# Altium footprint library Connectors THD.PcbLib: 631 footprints (part 42 of 46) (continued)
## TYCO_350584-4 [mm] "4 Circuits In-Line - Universal MATE-N-LOK Connector" (continued)

## TYCO_350711-1 [mm] "6 Circuits Mini-Universal MATE-N-LOK Connector"
height 14.73
pads (6):
  round 2.5 hole 1.8: 1(-6.35,-3.175) 2(0,-3.175) 3(6.35,-3.175) 4(-6.35,3.175) 5(0,3.175) 6(6.35,3.175)
Top Overlay:
  circle w0.2: c-6.35,3.175 r2.984
  circle w0.2: c-6.35,3.175 r2.604
  circle w0.2: c6.35,3.175 r2.984
  circle w0.2: c6.35,3.175 r2.604
  circle w0.2: c0,-3.175 r2.984
  circle w0.2: c0,-3.175 r2.604
  lines w0.2: -10.16,-6.985 -10.16,6.985 ; -10.16,-5.715 -11.43,-5.715 -11.43,-6.985 11.43,-6.985 11.43,-5.715 10.16,-5.715 ; -10.16,-0.635 -11.43,-0.635 -11.43,0.635 -10.16,0.635 ; -10.16,5.715 -11.43,5.715 -11.43,6.985 11.43,6.985 11.43,5.715 10.16,5.715 ; -1.981,-6.985 -1.981,-9.525 1.956,-9.525 1.956,-6.985 ; -1.981,6.985 -1.981,9.525 1.956,9.525 1.956,6.985 ; 10.16,-6.985 10.16,6.985 ; 10.16,-0.635 11.43,-0.635 11.43,0.635 10.16,0.635 ; -2.984,6.16 -2.984,3.175 ccw(c0,3.175) 2.984,3.175 2.985,6.16 ; -2.984,6.16 2.985,6.16 ; -2.985,6.16 -2.604,5.779 ; -2.604,5.779 2.604,5.779 ; -2.604,5.779 -2.604,3.175 ccw(c0,3.175) 2.604,3.175 2.604,5.779 ; 2.604,5.779 2.985,6.16 ; -9.334,-6.16 -9.334,-3.175 cw(c-6.35,-3.175) -3.366,-3.175 -3.366,-6.16 -9.334,-6.16 ; -8.954,-5.779 -8.954,-3.175 cw(c-6.35,-3.175) -3.747,-3.175 -3.747,-5.779 -8.954,-5.779 ; 3.366,-6.16 3.366,-3.175 cw(c6.35,-3.175) 9.334,-3.175 9.335,-6.16 3.366,-6.16 ; 3.747,-5.779 3.747,-3.175 cw(c6.35,-3.175) 8.954,-3.175 8.954,-5.779 3.747,-5.779
  text "3" at 10.78,-3.71 h1.2
  text "6" at 10.78,2.64 h1.2
  text "4" at -11.605,2.61 h1.2
  text "1" at -11.055,-3.765 h1.2
Mechanical 8:
  lines w0.1: -6.85,-3.175 -6.35,-3.175 ; -6.85,3.175 -6.35,3.175 ; -6.35,-3.675 -6.35,-3.175 ; -6.35,-2.675 -6.35,-3.175 ; -6.35,2.675 -6.35,3.175 ; -6.35,3.675 -6.35,3.175 ; -5.85,-3.175 -6.35,-3.175 ; -5.85,3.175 -6.35,3.175 ; -0.5,-3.175 0,-3.175 ; -0.5,0 0,0 ; -0.5,3.175 0,3.175 ; 0,-3.675 0,-3.175 ; 0,-2.675 0,-3.175 ; 0,-0.5 0,0 ; 0,0.5 0,0 ; 0,2.675 0,3.175 ; 0,3.675 0,3.175 ; 0.5,-3.175 0,-3.175 ; 0.5,0 0,0 ; 0.5,3.175 0,3.175 ; 5.85,-3.175 6.35,-3.175 ; 5.85,3.175 6.35,3.175 ; 6.35,-3.675 6.35,-3.175 ; 6.35,-2.675 6.35,-3.175 ; 6.35,2.675 6.35,3.175 ; 6.35,3.675 6.35,3.175 ; 6.85,-3.175 6.35,-3.175 ; 6.85,3.175 6.35,3.175
Mechanical 14:
  circle w0.1: c-6.35,3.175 r2.984
  circle w0.1: c-6.35,3.175 r2.604
  circle w0.1: c6.35,3.175 r2.984
  circle w0.1: c6.35,3.175 r2.604
  circle w0.1: c0,-3.175 r2.984
  circle w0.1: c0,-3.175 r2.604
  lines w0.1: -10.16,-6.985 -10.16,6.985 ; -10.16,-5.715 -11.43,-5.715 -11.43,-6.985 11.43,-6.985 11.43,-5.715 10.16,-5.715 ; -10.16,-0.635 -11.43,-0.635 -11.43,0.635 -10.16,0.635 ; -10.16,5.715 -11.43,5.715 -11.43,6.985 11.43,6.985 11.43,5.715 10.16,5.715 ; -1.981,-6.985 -1.981,-9.525 1.956,-9.525 1.956,-6.985 ; -1.981,6.985 -1.981,9.525 1.956,9.525 1.956,6.985 ; 10.16,-6.985 10.16,6.985 ; 10.16,-0.635 11.43,-0.635 11.43,0.635 10.16,0.635 ; -2.984,6.16 -2.984,3.175 ccw(c0,3.175) 2.984,3.175 2.985,6.16 ; -2.984,6.16 2.985,6.16 ; -2.985,6.16 -2.604,5.779 ; -2.604,5.779 2.604,5.779 ; -2.604,5.779 -2.604,3.175 ccw(c0,3.175) 2.604,3.175 2.604,5.779 ; 2.604,5.779 2.985,6.16 ; -9.334,-6.16 -9.334,-3.175 cw(c-6.35,-3.175) -3.366,-3.175 -3.366,-6.16 -9.334,-6.16 ; -8.954,-5.779 -8.954,-3.175 cw(c-6.35,-3.175) -3.747,-3.175 -3.747,-5.779 -8.954,-5.779 ; 3.366,-6.16 3.366,-3.175 cw(c6.35,-3.175) 9.334,-3.175 9.335,-6.16 3.366,-6.16 ; 3.747,-5.779 3.747,-3.175 cw(c6.35,-3.175) 8.954,-3.175 8.954,-5.779 3.747,-5.779
  text "3" at 10.78,-3.71 h1.2
  text "6" at 10.78,2.64 h1.2
  text "4" at -11.605,2.61 h1.2
  text "1" at -11.055,-3.765 h1.2
3D body: height 14.82, standoff -3.56, extent -11.43,-9.525 11.43,9.525

## TYCO_350712-1 [mm] "9 Circuits Mini-Universal MATE-N-LOK Connector"
height 14.73
pads (9):
  round 2.5 hole 1.8: 1(-6.35,6.35) 2(-6.35,0) 3(-6.35,-6.35) 4(0,6.35) 5(0,0) 6(0,-6.35) 7(6.35,6.35) 8(6.35,0) 9(6.35,-6.35)
Top Overlay:
  circle w0.2: c-6.35,0.032 r3.016
  circle w0.2: c6.35,6.382 r3.016
  circle w0.2: c6.35,-6.318 r3.016
  circle w0.2: c0,-6.318 r3.016
  circle w0.2: c0,0.032 r3.016
  circle w0.2: c0,6.382 r3.016
  lines w0.2: -10.16,-1.956 -12.7,-1.956 -12.7,1.981 -10.16,1.981 ; 10.16,-1.981 12.7,-1.981 12.7,1.956 10.16,1.956 ; -10.16,-11.43 -8.89,-11.43 -8.89,-10.16 -3.81,-10.16 -3.81,-11.43 -2.54,-11.43 -2.54,-10.16 2.54,-10.16 2.54,-11.43 3.81,-11.43 3.81,-10.16 8.89,-10.16 8.89,-11.43 10.16,-11.43 10.16,11.43 8.89,11.43 8.89,10.16 3.81,10.16 3.81,11.43 2.54,11.43 2.54,10.16 -2.54,10.16 -2.54,11.43 -3.81,11.43 -3.81,10.16 -8.89,10.16 -8.89,11.43 -10.16,11.43 -10.16,-11.43 ; -9.335,-9.335 -6.35,-9.335 ccw(c-6.35,-6.35) -6.35,-3.366 -9.335,-3.366 -9.335,-9.335 ; -9.335,3.366 -6.35,3.366 ccw(c-6.35,6.35) -6.35,9.334 -9.334,9.335 -9.335,3.366 ; 6.35,-2.984 cw(c6.35,0) 6.35,2.984 9.335,2.984 9.335,-2.985 6.35,-2.984
  text "7" at 6.773,10.627 h1.02
  text "4" at 0.465,10.63 h1.02
  text "1" at -5.885,10.63 h1.02
  text "6" at 0.465,-11.27 h1.02
  text "3" at -5.935,-11.27 h1.02
  text "9" at 6.765,-11.27 h1.02
Mechanical 8:
  lines w0.1: -7.35,-6.35 -6.35,-6.35 ; -7.35,0 -6.35,0 ; -7.35,6.35 -6.35,6.35 ; -6.35,-7.35 -6.35,-6.35 ; -6.35,-5.35 -6.35,-6.35 ; -6.35,-1 -6.35,0 ; -6.35,1 -6.35,0 ; -6.35,5.35 -6.35,6.35 ; -6.35,7.35 -6.35,6.35 ; -5.35,-6.35 -6.35,-6.35 ; -5.35,0 -6.35,0 ; -5.35,6.35 -6.35,6.35 ; -1,-6.35 0,-6.35 ; -1,0 0,0 ; -1,6.35 0,6.35 ; 0,-7.35 0,-6.35 ; 0,-5.35 0,-6.35 ; 0,-1 0,0 ; 0,1 0,0 ; 0,5.35 0,6.35 ; 0,7.35 0,6.35 ; 1,-6.35 0,-6.35 ; 1,0 0,0 ; 1,6.35 0,6.35 ; 5.35,-6.35 6.35,-6.35 ; 5.35,0 6.35,0 ; 5.35,6.35 6.35,6.35 ; 6.35,-7.35 6.35,-6.35 ; 6.35,-5.35 6.35,-6.35 ; 6.35,-1 6.35,0 ; 6.35,1 6.35,0 ; 6.35,5.35 6.35,6.35 ; 6.35,7.35 6.35,6.35 ; 7.35,-6.35 6.35,-6.35 ; 7.35,0 6.35,0 ; 7.35,6.35 6.35,6.35
Mechanical 14:
  circle w0.1: c-6.35,0.032 r3.016
  circle w0.1: c6.35,6.382 r3.016
  circle w0.1: c6.35,-6.318 r3.016
  circle w0.1: c0,-6.318 r3.016
  circle w0.1: c0,0.032 r3.016
  circle w0.1: c0,6.382 r3.016
  lines w0.1: -10.16,-1.956 -12.7,-1.956 -12.7,1.981 -10.16,1.981 ; 10.16,-1.981 12.7,-1.981 12.7,1.956 10.16,1.956 ; -10.16,-11.43 -8.89,-11.43 -8.89,-10.16 -3.81,-10.16 -3.81,-11.43 -2.54,-11.43 -2.54,-10.16 2.54,-10.16 2.54,-11.43 3.81,-11.43 3.81,-10.16 8.89,-10.16 8.89,-11.43 10.16,-11.43 10.16,11.43 8.89,11.43 8.89,10.16 3.81,10.16 3.81,11.43 2.54,11.43 2.54,10.16 -2.54,10.16 -2.54,11.43 -3.81,11.43 -3.81,10.16 -8.89,10.16 -8.89,11.43 -10.16,11.43 -10.16,-11.43 ; -9.335,-9.335 -6.35,-9.335 ccw(c-6.35,-6.35) -6.35,-3.366 -9.335,-3.366 -9.335,-9.335 ; -9.335,3.366 -6.35,3.366 ccw(c-6.35,6.35) -6.35,9.334 -9.334,9.335 -9.335,3.366 ; 6.35,-2.984 cw(c6.35,0) 6.35,2.984 9.335,2.984 9.335,-2.985 6.35,-2.984
  text "7" at 6.773,10.627 h1.02
  text "4" at 0.465,10.63 h1.02
  text "1" at -5.885,10.63 h1.02
  text "6" at 0.465,-11.27 h1.02
  text "3" at -5.935,-11.27 h1.02
  text "9" at 6.765,-11.27 h1.02
3D body: height 14.82, standoff -3.56, extent -12.7,-11.43 12.7,11.43

## TYCO_350713-1 [mm] "12 Circuits Mini-Universal MATE-N-LOK Connector"
height 14.73
pads (12):
  round 2.5 hole 1.8: 1(-9.525,6.35) 2(-9.525,0) 3(-9.525,-6.35) 4(-3.175,6.35) 5(-3.175,0) 6(-3.175,-6.35) 7(3.175,6.35) 8(3.175,0) 9(3.175,-6.35) 10(9.525,6.35) 11(9.525,0) 12(9.525,-6.35)
Top Overlay:
  circle w0.2: c-9.525,0 r2.984
  circle w0.2: c-3.175,6.35 r2.984
  circle w0.2: c-3.175,0 r2.984
  circle w0.2: c-3.175,-6.35 r2.984
  circle w0.2: c3.175,-6.35 r2.984
  circle w0.2: c3.175,0 r2.984
  circle w0.2: c3.175,6.35 r2.984
  circle w0.2: c9.525,6.35 r2.984
  circle w0.2: c9.525,-6.35 r2.984
  lines w0.2: -13.335,-10.16 13.335,-10.16 ; -13.335,-1.981 -15.875,-1.981 -15.875,1.956 -13.335,1.956 ; -13.335,10.16 13.335,10.16 ; -12.065,-10.16 -12.065,-11.43 -13.335,-11.43 -13.335,11.43 -12.065,11.43 -12.065,10.16 ; -6.985,-10.16 -6.985,-11.43 -5.715,-11.43 -5.715,-10.16 ; -6.985,10.16 -6.985,11.43 -5.715,11.43 -5.715,10.16 ; -0.635,-10.16 -0.635,-11.43 0.635,-11.43 0.635,-10.16 ; -0.635,10.16 -0.635,11.43 0.635,11.43 0.635,10.16 ; 5.715,-10.16 5.715,-11.43 6.985,-11.43 6.985,-10.16 ; 5.715,10.16 5.715,11.43 6.985,11.43 6.985,10.16 ; 12.065,-10.16 12.065,-11.43 13.335,-11.43 13.335,11.43 12.065,11.43 12.065,10.16 ; 13.335,-1.981 15.875,-1.981 15.875,1.956 13.335,1.956 ; -12.51,-9.335 -9.525,-9.334 ccw(c-9.525,-6.35) -9.525,-3.366 -12.51,-3.366 -12.51,-9.335 ; -12.51,3.366 -12.51,9.335 -9.525,9.334 cw(c-9.525,6.35) -9.525,3.366 -12.51,3.366 ; 9.525,-2.984 cw(c9.525,0) 9.525,2.984 12.51,2.985 12.51,-2.985 9.525,-2.984
  text "10" at 9.948,10.652 h1.02
  text "12" at 9.94,-12.17 h1.02
  text "7" at 3.598,10.627 h1.02
  text "4" at -2.71,10.63 h1.02
  text "1" at -9.06,10.63 h1.02
  text "6" at -2.71,-11.27 h1.02
  text "3" at -9.11,-11.27 h1.02
  text "9" at 3.59,-11.27 h1.02
Mechanical 8:
  lines w0.1: -10.025,-6.35 -9.525,-6.35 ; -10.025,0 -9.525,0 ; -10.025,6.35 -9.525,6.35 ; -9.525,-6.85 -9.525,-6.35 ; -9.525,-5.85 -9.525,-6.35 ; -9.525,-0.5 -9.525,0 ; -9.525,0.5 -9.525,0 ; -9.525,5.85 -9.525,6.35 ; -9.525,6.85 -9.525,6.35 ; -9.025,-6.35 -9.525,-6.35 ; -9.025,0 -9.525,0 ; -9.025,6.35 -9.525,6.35 ; -3.675,-6.35 -3.175,-6.35 ; -3.675,0 -3.175,0 ; -3.675,6.35 -3.175,6.35 ; -3.175,-6.85 -3.175,-6.35 ; -3.175,-5.85 -3.175,-6.35 ; -3.175,-0.5 -3.175,0 ; -3.175,0.5 -3.175,0 ; -3.175,5.85 -3.175,6.35 ; -3.175,6.85 -3.175,6.35 ; -2.675,-6.35 -3.175,-6.35 ; -2.675,0 -3.175,0 ; -2.675,6.35 -3.175,6.35 ; -0.5,0 0,0 ; 0,-0.5 0,0 ; 0,0.5 0,0 ; 0.5,0 0,0 ; 2.675,-6.35 3.175,-6.35 ; 2.675,0 3.175,0 ; 2.675,6.35 3.175,6.35 ; 3.175,-6.85 3.175,-6.35 ; 3.175,-5.85 3.175,-6.35 ; 3.175,-0.5 3.175,0 ; 3.175,0.5 3.175,0 ; 3.175,5.85 3.175,6.35 ; 3.175,6.85 3.175,6.35 ; 3.675,-6.35 3.175,-6.35 ; 3.675,0 3.175,0 ; 3.675,6.35 3.175,6.35 ; 9.025,-6.35 9.525,-6.35 ; 9.025,0 9.525,0 ; 9.025,6.35 9.525,6.35 ; 9.525,-6.85 9.525,-6.35 ; 9.525,-5.85 9.525,-6.35 ; 9.525,-0.5 9.525,0 ; 9.525,0.5 9.525,0 ; 9.525,5.85 9.525,6.35 ; 9.525,6.85 9.525,6.35 ; 10.025,-6.35 9.525,-6.35 ; 10.025,0 9.525,0 ; 10.025,6.35 9.525,6.35
Mechanical 14:
  circle w0.1: c-9.525,0 r2.984
  circle w0.1: c-3.175,6.35 r2.984
  circle w0.1: c-3.175,0 r2.984
  circle w0.1: c-3.175,-6.35 r2.984
  circle w0.1: c3.175,-6.35 r2.984
  circle w0.1: c3.175,0 r2.984
  circle w0.1: c3.175,6.35 r2.984
  circle w0.1: c9.525,6.35 r2.984
  circle w0.1: c9.525,-6.35 r2.984
  lines w0.1: -13.335,-10.16 13.335,-10.16 ; -13.335,-1.981 -15.875,-1.981 -15.875,1.956 -13.335,1.956 ; -13.335,10.16 13.335,10.16 ; -12.065,-10.16 -12.065,-11.43 -13.335,-11.43 -13.335,11.43 -12.065,11.43 -12.065,10.16 ; -6.985,-10.16 -6.985,-11.43 -5.715,-11.43 -5.715,-10.16 ; -6.985,10.16 -6.985,11.43 -5.715,11.43 -5.715,10.16 ; -0.635,-10.16 -0.635,-11.43 0.635,-11.43 0.635,-10.16 ; -0.635,10.16 -0.635,11.43 0.635,11.43 0.635,10.16 ; 5.715,-10.16 5.715,-11.43 6.985,-11.43 6.985,-10.16 ; 5.715,10.16 5.715,11.43 6.985,11.43 6.985,10.16 ; 12.065,-10.16 12.065,-11.43 13.335,-11.43 13.335,11.43 12.065,11.43 12.065,10.16 ; 13.335,-1.981 15.875,-1.981 15.875,1.956 13.335,1.956 ; -12.51,-9.335 -9.525,-9.334 ccw(c-9.525,-6.35) -9.525,-3.366 -12.51,-3.366 -12.51,-9.335 ; -12.51,3.366 -12.51,9.335 -9.525,9.334 cw(c-9.525,6.35) -9.525,3.366 -12.51,3.366 ; 9.525,-2.984 cw(c9.525,0) 9.525,2.984 12.51,2.985 12.51,-2.985 9.525,-2.984
  text "10" at 9.948,10.652 h1.02
  text "12" at 9.94,-12.17 h1.02
  text "7" at 3.598,10.627 h1.02
  text "4" at -2.71,10.63 h1.02
  text "1" at -9.06,10.63 h1.02
  text "6" at -2.71,-11.27 h1.02
  text "3" at -9.11,-11.27 h1.02
  text "9" at 3.59,-11.27 h1.02
3D body: height 14.82, standoff -3.56, extent -15.875,-11.43 15.875,11.43

## TYCO_350786-1 [mm] "2 Circuits In-Line - Mini-Universal MATE-N-LOK Connector"
height 14.73
pads (2):
  round 2.5 hole 1.8: 1(-3.175,0) 2(3.175,0)
Top Overlay:
  lines w0.2: -7.325,-1.27 -7.325,1.27 ; -5.715,-3.81 -5.715,-5.08 -6.985,-5.08 -6.985,-3.81 ; -0.635,-3.81 -0.635,-5.08 0.635,-5.08 0.635,-3.81 ; 5.715,-3.81 5.715,-5.08 6.985,-5.08 6.985,-3.81 ; 7.325,-1.27 7.325,1.27 ; -6.985,-3.81 -6.985,-1.27 -9.525,-1.27 -9.525,1.27 -6.985,1.27 -6.985,3.81 6.985,3.81 6.985,1.27 9.525,1.27 9.525,-1.27 6.985,-1.27 6.985,-3.81 ; -6.985,-3.81 6.985,-3.81 ; -6.16,-2.985 -6.159,0 cw(c-3.175,0) -0.191,0 -0.191,-2.985 ; -6.16,-2.985 -0.191,-2.985 ; -6.16,-2.985 -5.779,-2.604 ; -5.779,-2.604 -0.572,-2.604 ; -5.779,-2.604 -5.779,0 cw(c-3.175,0) -0.572,0 -0.572,-2.604 ; -0.572,-2.604 -0.191,-2.985 ; 0.191,-2.985 0.191,0 cw(c3.175,0) 6.159,0 6.16,-2.985 ; 0.191,-2.985 6.16,-2.985 ; 0.191,-2.985 0.572,-2.604 ; 0.572,-2.604 5.779,-2.604 ; 0.572,-2.604 0.572,0 cw(c3.175,0) 5.779,0 5.779,-2.604 ; 5.779,-2.604 6.16,-2.985
  text "2" at 3.81,-4.905 h1.02
  text "1" at -2.54,-4.68 h1.02
Mechanical 8:
  lines w0.1: -1,0 0,0 0,-1
Mechanical 14:
  lines w0.1: -7.325,-1.27 -7.325,1.27 ; -5.715,-3.81 -5.715,-5.08 -6.985,-5.08 -6.985,-3.81 ; -0.635,-3.81 -0.635,-5.08 0.635,-5.08 0.635,-3.81 ; 5.715,-3.81 5.715,-5.08 6.985,-5.08 6.985,-3.81 ; 7.325,-1.27 7.325,1.27 ; -6.985,-3.81 -6.985,-1.27 -9.525,-1.27 -9.525,1.27 -6.985,1.27 -6.985,3.81 6.985,3.81 6.985,1.27 9.525,1.27 9.525,-1.27 6.985,-1.27 6.985,-3.81 ; -6.985,-3.81 6.985,-3.81 ; -6.16,-2.985 -6.159,0 cw(c-3.175,0) -0.191,0 -0.191,-2.985 ; -6.16,-2.985 -0.191,-2.985 ; -6.16,-2.985 -5.779,-2.604 ; -5.779,-2.604 -0.572,-2.604 ; -5.779,-2.604 -5.779,0 cw(c-3.175,0) -0.572,0 -0.572,-2.604 ; -0.572,-2.604 -0.191,-2.985 ; 0.191,-2.985 0.191,0 cw(c3.175,0) 6.159,0 6.16,-2.985 ; 0.191,-2.985 6.16,-2.985 ; 0.191,-2.985 0.572,-2.604 ; 0.572,-2.604 5.779,-2.604 ; 0.572,-2.604 0.572,0 cw(c3.175,0) 5.779,0 5.779,-2.604 ; 5.779,-2.604 6.16,-2.985
  text "2" at 3.81,-4.905 h1.02
  text "1" at -2.54,-4.68 h1.02
3D body: height 14.82, standoff -3.56, extent -9.525,-5.08 9.525,3.81

## TYCO_350789-1 [mm] "3 Circuits In-Line - Mini-Universal MATE-N-LOK Connector"
height 14.73
pads (3):
  round 2.5 hole 1.8: 1(-6.35,0) 2(0,0) 3(6.35,0)
Top Overlay:
  circle w0.2: c0,0 r2.984
  circle w0.2: c0,0 r2.604
  lines w0.2: -10.5,-1.27 -10.5,1.27 ; -8.89,-3.81 -8.89,-5.08 -10.16,-5.08 -10.16,-3.81 ; -3.81,-3.81 -3.81,-5.08 -2.54,-5.08 -2.54,-3.81 ; 2.54,-3.81 2.54,-5.08 3.81,-5.08 3.81,-3.81 ; 8.91,-3.81 8.89,-5.08 10.16,-5.08 10.16,-3.81 ; 10.5,-1.27 10.5,1.27 ; -10.16,-3.81 -10.16,-1.27 -12.7,-1.27 -12.7,1.27 -10.16,1.27 -10.16,3.81 10.16,3.81 10.16,1.27 12.7,1.27 12.7,-1.27 10.16,-1.27 10.16,-3.81 ; -10.16,-3.81 10.16,-3.81 ; -9.335,-2.985 -8.954,-2.604 ; -9.335,-2.985 -9.334,0 cw(c-6.35,0) -3.366,0 -3.366,-2.985 ; -9.335,-2.985 -3.366,-2.985 ; -8.954,-2.604 -8.954,0 cw(c-6.35,0) -3.746,0 -3.747,-2.604 ; -8.954,-2.604 -3.747,-2.604 ; -3.747,-2.604 -3.366,-2.985 ; 3.366,-2.985 3.747,-2.604 ; 3.366,-2.985 9.335,-2.985 ; 3.366,-2.985 3.366,0 cw(c6.35,0) 9.334,0 9.335,-2.985 ; 3.747,-2.604 3.747,0 cw(c6.35,0) 8.954,0 8.954,-2.604 ; 3.747,-2.604 8.954,-2.604 ; 8.954,-2.604 9.335,-2.985
  text "1" at -5.715,-5.08 h1.02
  text "2" at 0.635,-5.08 h1.02
  text "3" at 6.985,-5.08 h1.02
Mechanical 14:
  circle w0.1: c0,0 r2.984
  circle w0.1: c0,0 r2.604
  lines w0.1: -10.5,-1.27 -10.5,1.27 ; -8.89,-3.81 -8.89,-5.08 -10.16,-5.08 -10.16,-3.81 ; -3.81,-3.81 -3.81,-5.08 -2.54,-5.08 -2.54,-3.81 ; 2.54,-3.81 2.54,-5.08 3.81,-5.08 3.81,-3.81 ; 8.91,-3.81 8.89,-5.08 10.16,-5.08 10.16,-3.81 ; 10.5,-1.27 10.5,1.27 ; -10.16,-3.81 -10.16,-1.27 -12.7,-1.27 -12.7,1.27 -10.16,1.27 -10.16,3.81 10.16,3.81 10.16,1.27 12.7,1.27 12.7,-1.27 10.16,-1.27 10.16,-3.81 ; -10.16,-3.81 10.16,-3.81 ; -9.335,-2.985 -8.954,-2.604 ; -9.335,-2.985 -9.334,0 cw(c-6.35,0) -3.366,0 -3.366,-2.985 ; -9.335,-2.985 -3.366,-2.985 ; -8.954,-2.604 -8.954,0 cw(c-6.35,0) -3.746,0 -3.747,-2.604 ; -8.954,-2.604 -3.747,-2.604 ; -3.747,-2.604 -3.366,-2.985 ; 3.366,-2.985 3.747,-2.604 ; 3.366,-2.985 9.335,-2.985 ; 3.366,-2.985 3.366,0 cw(c6.35,0) 9.334,0 9.335,-2.985 ; 3.747,-2.604 3.747,0 cw(c6.35,0) 8.954,0 8.954,-2.604 ; 3.747,-2.604 8.954,-2.604 ; 8.954,-2.604 9.335,-2.985
  text "1" at -5.715,-5.08 h1.02
  text "2" at 0.635,-5.08 h1.02
  text "3" at 6.985,-5.08 h1.02
3D body: height 14.82, standoff -3.56, extent -12.7,-5.08 12.7,3.81

## TYCO_350792-1 [mm] "4 Circuits In-Line - Mini-Universal MATE-N-LOK Connector"
height 14.73
pads (4):
  round 2.5 hole 1.8: 1(-9.525,0) 2(-3.175,0) 3(3.175,0) 4(9.525,0)
Top Overlay:
  circle w0.2: c3.175,0 r2.984
  circle w0.2: c-3.175,0 r2.984
  circle w0.2: c3.175,0 r2.604
  circle w0.2: c-3.175,0 r2.604
  lines w0.2: -13.675,-1.27 -13.675,1.27 ; -12.065,-3.81 -12.065,-5.08 -13.335,-5.08 -13.335,-3.81 ; -6.985,-3.81 -6.985,-5.08 -5.715,-5.08 -5.715,-3.81 ; -0.635,-3.81 -0.635,-5.08 0.635,-5.08 0.635,-3.81 ; 5.715,-3.81 5.715,-5.08 6.985,-5.08 6.985,-3.81 ; 12.065,-3.81 12.065,-5.08 13.335,-5.08 13.335,-3.81 ; 13.675,-1.27 13.675,1.27 ; -13.335,-3.81 13.335,-3.81 ; -13.335,-3.81 -13.335,-1.27 -15.875,-1.27 -15.875,1.27 -13.335,1.27 -13.335,3.81 13.335,3.81 13.335,1.27 15.875,1.27 15.875,-1.27 13.335,-1.27 13.335,-3.81 ; -12.51,-2.985 -12.129,-2.604 ; -12.51,-2.985 -6.541,-2.985 ; -12.51,-2.985 -12.509,0 cw(c-9.525,0) -6.541,0 -6.541,-2.985 ; -12.129,-2.604 -12.129,0 cw(c-9.525,0) -6.922,0 -6.922,-2.604 ; -12.129,-2.604 -6.922,-2.604 ; -6.922,-2.604 -6.541,-2.985 ; 6.541,-2.985 6.922,-2.604 ; 6.541,-2.985 12.51,-2.985 ; 6.541,-2.985 6.541,0 cw(c9.525,0) 12.509,0 12.51,-2.985 ; 6.922,-2.604 12.129,-2.604 ; 6.922,-2.604 6.922,0 cw(c9.525,0) 12.129,0 12.129,-2.604 ; 12.129,-2.604 12.51,-2.985
  text "4" at 10.16,-5.08 h1.02
  text "3" at 3.81,-5.08 h1.02
  text "2" at -2.54,-5.08 h1.02
  text "1" at -8.89,-5.08 h1.02
Mechanical 8:
  lines w0.1: -1,0 0,0 0,-1
Mechanical 14:
  circle w0.1: c3.175,0 r2.984
  circle w0.1: c-3.175,0 r2.984
  circle w0.1: c3.175,0 r2.604
  circle w0.1: c-3.175,0 r2.604
  lines w0.1: -13.675,-1.27 -13.675,1.27 ; -12.065,-3.81 -12.065,-5.08 -13.335,-5.08 -13.335,-3.81 ; -6.985,-3.81 -6.985,-5.08 -5.715,-5.08 -5.715,-3.81 ; -0.635,-3.81 -0.635,-5.08 0.635,-5.08 0.635,-3.81 ; 5.715,-3.81 5.715,-5.08 6.985,-5.08 6.985,-3.81 ; 12.065,-3.81 12.065,-5.08 13.335,-5.08 13.335,-3.81 ; 13.675,-1.27 13.675,1.27 ; -13.335,-3.81 13.335,-3.81 ; -13.335,-3.81 -13.335,-1.27 -15.875,-1.27 -15.875,1.27 -13.335,1.27 -13.335,3.81 13.335,3.81 13.335,1.27 15.875,1.27 15.875,-1.27 13.335,-1.27 13.335,-3.81 ; -12.51,-2.985 -12.129,-2.604 ; -12.51,-2.985 -12.509,0 cw(c-9.525,0) -6.541,0 -6.541,-2.985 ; -12.51,-2.985 -6.541,-2.985 ; -12.129,-2.604 -12.129,0 cw(c-9.525,0) -6.922,0 -6.922,-2.604 ; -12.129,-2.604 -6.922,-2.604 ; -6.922,-2.604 -6.541,-2.985 ; 6.541,-2.985 6.922,-2.604 ; 6.541,-2.985 6.541,0 cw(c9.525,0) 12.509,0 12.51,-2.985 ; 6.541,-2.985 12.51,-2.985 ; 6.922,-2.604 12.129,-2.604 ; 6.922,-2.604 6.922,0 cw(c9.525,0) 12.129,0 12.129,-2.604 ; 12.129,-2.604 12.51,-2.985
  text "4" at 10.16,-5.08 h1.02
  text "3" at 3.81,-5.08 h1.02
  text "2" at -2.54,-5.08 h1.02
  text "1" at -8.89,-5.08 h1.02
3D body: height 14.82, standoff -3.56, extent -15.875,-5.08 15.875,3.81

## TYCO_380598-2 [mm] "Reuseable Component Receptacle (Mating Pin Dia. Range 0.46 to1.02mm) With Closed Bottom Sleeve"
height 0.89
pads (1):
  round 4 hole 2.3: 1(0,0)
Top Overlay:
  circle w0.2: c0,0 r2.3
Mechanical 8:
  lines w0.1: -0.5,0 0,0 ; 0,-0.5 0,0 ; 0,0.5 0,0 ; 0.5,0 0,0
Mechanical 14:
  circle w0.1: c0,0 r0.667
  circle w0.1: c0,0 r1.118
  circle w0.1: c0,0.006 r1.587
3D body: height 0.89, standoff -5.52, extent -1.587,-1.581 1.588,1.594

## TYCO_640453-2 [mm] "2 Circuits, 2.54mm (.100\") Pitch,Single Row Right Angle Header, Type  MTA-100"
height 4.76
pads (2):
  round 1.7 hole 1: 1(-1.27,0.002) 2(1.27,-0.002)
Top Overlay:
  lines w0.2: -1.587,1.105 -1.587,10.033 -0.953,10.033 -0.953,1.105 ; -1.587,2.54 -2.54,2.54 -2.54,-2.54 2.54,-2.54 2.54,2.54 1.587,2.54 ; -0.953,2.54 0.953,2.54 ; 0.953,1.105 0.953,10.033 1.587,10.033 1.587,1.105
  text "1" at -3.19,-0.503 h1
Mechanical 8:
  lines w0.1: -2.27,0 -1.27,0 ; -1.27,-1 -1.27,0 ; -1.27,1 -1.27,0 ; -1,0 0,0 ; -0.27,0 -1.27,0 ; 0,-1 0,0 ; 0,1 0,0 ; 0.27,0 1.27,0 ; 1,0 0,0 ; 1.27,-1 1.27,0 ; 1.27,1 1.27,0 ; 2.27,0 1.27,0
Mechanical 14:
  lines w0.1: -1.587,2.54 -2.54,2.54 -2.54,-2.54 2.54,-2.54 2.54,2.54 1.587,2.54 ; -0.953,2.54 0.953,2.54 ; -1.587,-0.318 -0.953,-0.318 -0.953,10.033 -1.587,10.033 -1.587,-0.318 ; 0.953,-0.312 0.953,10.033 1.587,10.033 1.587,-0.312 0.953,-0.312
  text "1" at -3.19,-0.503 h1
3D body: height 4.43, standoff -3.56, extent -2.54,-2.54 2.54,10.033

## TYCO_640900-1 [mm] "5 Circuits In-Line - Mini-Universal MATE-N-LOK Connector"
height 14.73
pads (5):
  round 2.5 hole 1.8: 1(-12.7,0) 2(-6.35,0) 3(0,0) 4(6.35,0) 5(12.7,0)
Top Overlay:
  circle w0.2: c-6.35,0 r2.984
  circle w0.2: c-6.35,0 r2.604
  circle w0.2: c0,0 r2.604
  circle w0.2: c0,0 r2.984
  circle w0.2: c6.35,0 r2.604
  circle w0.2: c6.35,0 r2.984
  lines w0.2: -16.85,-1.27 -16.85,1.27 ; -15.24,-3.81 -15.24,-5.08 -16.51,-5.08 -16.51,-3.81 ; -10.16,-3.81 -10.16,-5.08 -8.89,-5.08 -8.89,-3.81 ; -3.81,-3.81 -3.81,-5.08 -2.54,-5.08 -2.54,-3.81 ; 2.54,-3.81 2.54,-5.08 3.81,-5.08 3.81,-3.81 ; 8.89,-3.81 8.89,-5.08 10.16,-5.08 10.16,-3.81 ; 15.24,-3.81 15.24,-5.08 16.51,-5.08 16.51,-3.81 ; 16.85,-1.27 16.85,1.27 ; -16.51,-3.81 16.51,-3.81 ; -16.51,-3.81 -16.51,-1.27 -19.05,-1.27 -19.05,1.27 -16.51,1.27 -16.51,3.81 16.51,3.81 16.51,1.27 19.05,1.27 19.05,-1.27 16.51,-1.27 16.51,-3.81 ; -15.685,-2.985 -9.716,-2.985 ; -15.685,-2.985 -15.684,0 cw(c-12.7,0) -9.716,0 -9.716,-2.985 ; -15.685,-2.985 -15.304,-2.604 ; -15.304,-2.604 -10.097,-2.604 ; -15.304,-2.604 -15.304,0 cw(c-12.7,0) -10.097,0 -10.097,-2.604 ; -10.097,-2.604 -9.716,-2.985 ; 9.716,-2.985 9.716,0 cw(c12.7,0) 15.684,0 15.685,-2.985 ; 9.716,-2.985 15.685,-2.985 ; 9.716,-2.985 10.097,-2.604 ; 10.097,-2.604 10.097,0 cw(c12.7,0) 15.304,0 15.304,-2.604 ; 10.097,-2.604 15.304,-2.604 ; 15.304,-2.604 15.685,-2.985
  text "5" at 13.335,-5.08 h1.02
  text "4" at 6.985,-5.08 h1.02
  text "3" at 0.635,-5.08 h1.02
  text "2" at -5.715,-5.08 h1.02
  text "1" at -12.065,-5.08 h1.02
Mechanical 14:
  circle w0.1: c-6.35,0 r2.984
  circle w0.1: c-6.35,0 r2.604
  circle w0.1: c0,0 r2.604
  circle w0.1: c0,0 r2.984
  circle w0.1: c6.35,0 r2.604
  circle w0.1: c6.35,0 r2.984
  lines w0.1: -16.85,-1.27 -16.85,1.27 ; -15.24,-3.81 -15.24,-5.08 -16.51,-5.08 -16.51,-3.81 ; -10.16,-3.81 -10.16,-5.08 -8.89,-5.08 -8.89,-3.81 ; -3.81,-3.81 -3.81,-5.08 -2.54,-5.08 -2.54,-3.81 ; 2.54,-3.81 2.54,-5.08 3.81,-5.08 3.81,-3.81 ; 8.89,-3.81 8.89,-5.08 10.16,-5.08 10.16,-3.81 ; 15.24,-3.81 15.24,-5.08 16.51,-5.08 16.51,-3.81 ; 16.85,-1.27 16.85,1.27 ; -16.51,-3.81 16.51,-3.81 ; -16.51,-3.81 -16.51,-1.27 -19.05,-1.27 -19.05,1.27 -16.51,1.27 -16.51,3.81 16.51,3.81 16.51,1.27 19.05,1.27 19.05,-1.27 16.51,-1.27 16.51,-3.81 ; -15.685,-2.985 -9.716,-2.985 ; -15.685,-2.985 -15.684,0 cw(c-12.7,0) -9.716,0 -9.716,-2.985 ; -15.685,-2.985 -15.304,-2.604 ; -15.304,-2.604 -10.097,-2.604 ; -15.304,-2.604 -15.304,0 cw(c-12.7,0) -10.097,0 -10.097,-2.604 ; -10.097,-2.604 -9.716,-2.985 ; 9.716,-2.985 9.716,0 cw(c12.7,0) 15.684,0 15.685,-2.985 ; 9.716,-2.985 15.685,-2.985 ; 9.716,-2.985 10.097,-2.604 ; 10.097,-2.604 10.097,0 cw(c12.7,0) 15.304,0 15.304,-2.604 ; 10.097,-2.604 15.304,-2.604 ; 15.304,-2.604 15.685,-2.985
  text "5" at 13.335,-5.08 h1.02
  text "4" at 6.985,-5.08 h1.02
  text "3" at 0.635,-5.08 h1.02
  text "2" at -5.715,-5.08 h1.02
  text "1" at -12.065,-5.08 h1.02
3D body: height 14.82, standoff -3.56, extent -19.05,-5.08 19.05,3.81

## TYCO_725963-2 [mm] "Right Angle FASTON TAB 2.8 x 0.8mm"
height 6
pads (2):
  round 2.1 hole 1.4: 1(-2.5,0) 1(2.5,0)
Top Overlay:
  lines w0.2: -3.7,-0.4 -10.245,-0.4 -10.245,0.4 -3.7,0.4 ; -1.3,-0.4 1.3,-0.4 ; -1.3,0.4 1.3,0.4
Mechanical 8:
  lines w0.1: -3.5,0 -2.5,0 ; -2.5,-1 -2.5,0 ; -2.5,1 -2.5,0 ; -1.5,0 -2.5,0 ; -1,0 0,0 ; 0,-1 0,0 ; 0,1 0,0 ; 1,0 0,0 ; 1.5,0 2.5,0 ; 2.5,-1 2.5,0 ; 2.5,1 2.5,0 ; 3.5,0 2.5,0
Mechanical 14:
  lines w0.1: -9.845,-0.4 -9.845,0.4 ; 0.655,-0.4 0.655,0.4 ; -10.245,-0.4 -10.245,0.4 3.155,0.4 3.155,-0.4 -10.245,-0.4
3D body: height 6, standoff -2, extent -10.245,-0.4 3.155,0.4